# Altium schematic symbol library Regulator_Linear.SchLib: 1452 symbols (part 6 of 10)
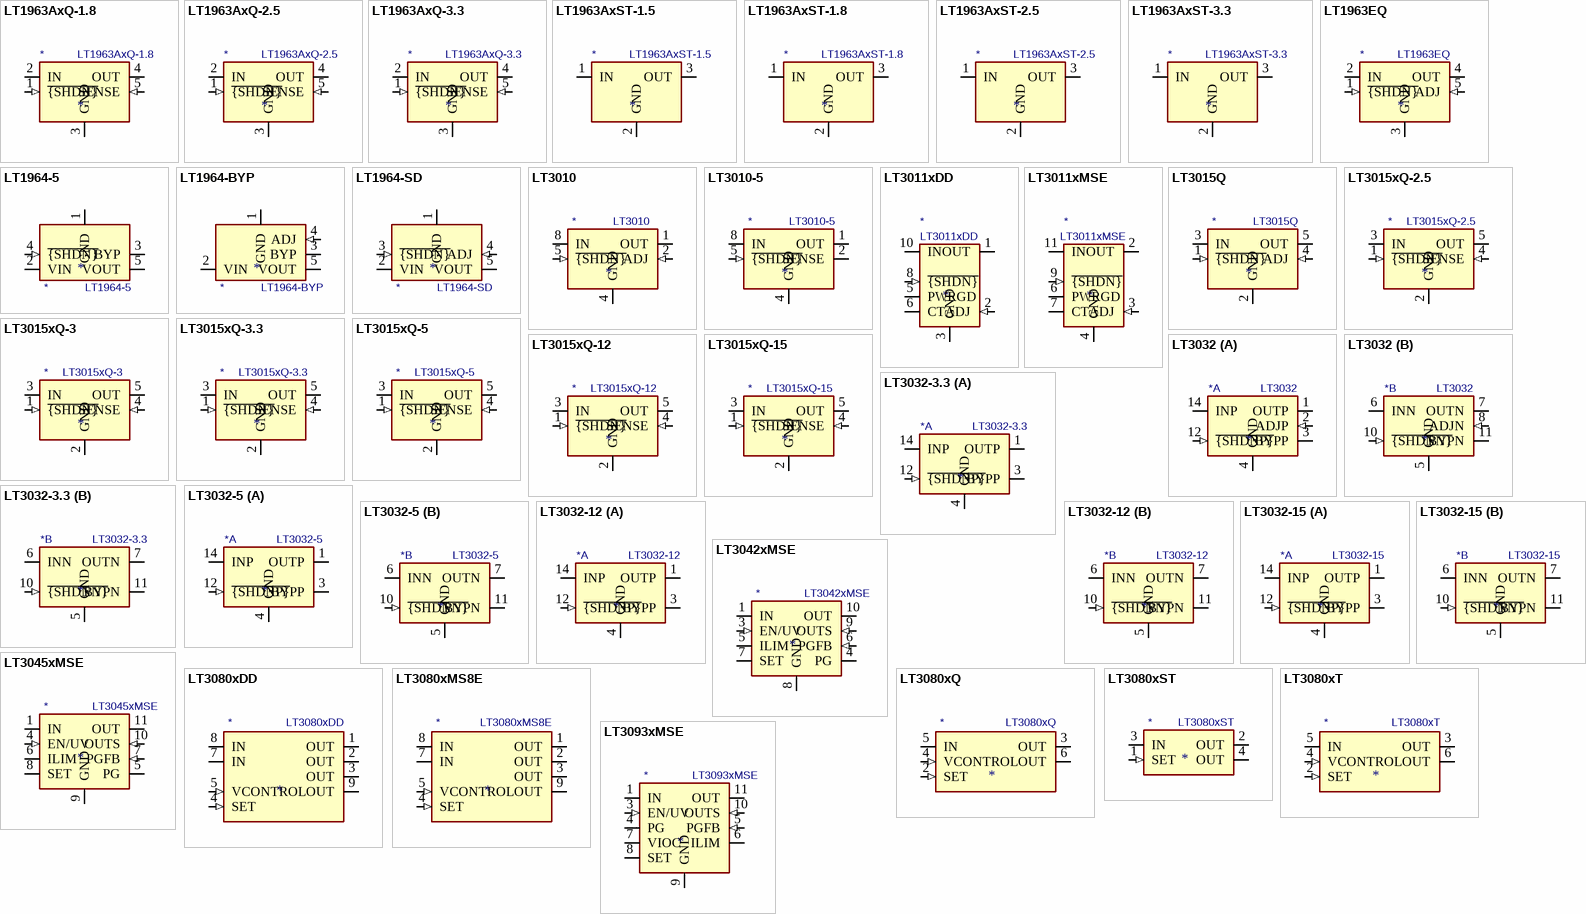
[diagram p41: symbols LT1963AxQ-1.8 to LT3093xMSE]

## LT3032-12
designator *  value LT3032-12
ki_keywords: LDO low noise; ki_description: 150mA, Dual Low Dropout Linear Regulator, Positive/Negative Low Noise, 12V Output, DFN-14; ki_fp_filters: Linear*DE14MA*; Footprint: Package_DFN_QFN:Linear_DE14MA; Supplier: https://www.analog.com/media/en/technical-documentation/data-sheets/3032ff.pdf
footprint Linear_DE14MA
part A pins: 1 OUTP (power), 2 NC (in) hidden, 3 BYPP, 4 GND (power), 12 ~{{SHDNP}} (in), 13 NC (in) hidden, 14 INP (power)
part B pins: 5 GND (power), 6 INN (power), 7 OUTN (power), 8 NC (in) hidden, 9 INN hidden, 10 ~{{SHDNN}} (in), 11 BYPN

## LT3032-15
designator *  value LT3032-15
ki_keywords: LDO low noise; ki_description: 150mA, Dual Low Dropout Linear Regulator, Positive/Negative Low Noise, 15V Output, DFN-14; ki_fp_filters: Linear*DE14MA*; Footprint: Package_DFN_QFN:Linear_DE14MA; Supplier: https://www.analog.com/media/en/technical-documentation/data-sheets/3032ff.pdf
footprint Linear_DE14MA
part A pins: 1 OUTP (power), 2 NC (in) hidden, 3 BYPP, 4 GND (power), 12 ~{{SHDNP}} (in), 13 NC (in) hidden, 14 INP (power)
part B pins: 5 GND (power), 6 INN (power), 7 OUTN (power), 8 NC (in) hidden, 9 INN hidden, 10 ~{{SHDNN}} (in), 11 BYPN

## LT3042xMSE
designator *  value LT3042xMSE
ki_keywords: linear voltage regulator low-noise; ki_description: 200mA, Adjustable, Ultralow Noise, Ultrahigh PSRR RF Linear Regulator, MSOP-10; ki_fp_filters: MSOP*1EP*3x3mm*P0.5mm*; Footprint: Package_SO:MSOP-10-1EP_3x3mm_P0.5mm_EP1.68x1.88mm; Supplier: https://www.analog.com/media/en/technical-documentation/data-sheets/3042fb.pdf
footprint MSOP-10-1EP_3x3mm_P0.5mm_EP1.68x1.88mm
pins: 1 IN (power), 2 IN hidden, 3 EN/UV (in), 4 PG (oc), 5 ILIM, 6 PGFB (in), 7 SET, 8 GND (power), 9 OUTS (in), 10 OUT (power), 11 GND hidden

## LT3045xMSE
designator *  value LT3045xMSE
ki_keywords: linear voltage regulator low-noise; ki_description: 500mA, Adjustable, Ultralow Noise, Ultrahigh PSRR Linear Regulator, MSOP-12; ki_fp_filters: MSOP*1EP*3x4mm*P0.65mm*; Footprint: Package_SO:MSOP-12-1EP_3x4mm_P0.65mm_EP1.65x2.85mm; Supplier: https://www.analog.com/media/en/technical-documentation/data-sheets/3045fa.pdf
footprint MSOP-12-1EP_3x4mm_P0.65mm_EP1.65x2.85mm
pins: 1 IN (power), 2 IN hidden, 3 IN hidden, 4 EN/UV (in), 5 PG (oc), 6 ILIM, 7 PGFB (in), 8 SET, 9 GND (power), 10 OUTS (in), 11 OUT (power), 12 OUT hidden, 13 GND hidden

## LT3080xDD
designator *  value LT3080xDD
ki_keywords: Adjustable 1.1A Low Dropout Regulator; ki_description: Adjustable 1.1A Single Resistor Low Dropout Regulator, DFN-8; ki_fp_filters: DFN*1EP?3x3mm*P0.5mm*; Footprint: Package_DFN_QFN:DFN-8-1EP_3x3mm_P0.5mm_EP1.66x2.38mm; Supplier: https://www.analog.com/media/en/technical-documentation/data-sheets/3080fc.pdf
footprint DFN-8-1EP_3x3mm_P0.5mm_EP1.66x2.38mm
pins: 1 OUT (power), 2 OUT (power), 3 OUT (power), 4 SET (in), 5 VCONTROL (in), 6 NC (in) hidden, 7 IN (power), 8 IN (power), 9 OUT (power)

## LT3080xMS8E
designator *  value LT3080xMS8E
ki_keywords: Adjustable 1.1A Low Dropout Regulator; ki_description: Adjustable 1.1A Single Resistor Low Dropout Regulator, MSOP-8; ki_fp_filters: MSOP*1EP?3x3mm*P0.65mm*; Footprint: Package_SO:MSOP-8-1EP_3x3mm_P0.65mm_EP1.68x1.88mm; Supplier: https://www.analog.com/media/en/technical-documentation/data-sheets/3080fc.pdf
footprint MSOP-8-1EP_3x3mm_P0.65mm_EP1.68x1.88mm
pins: 1 OUT (power), 2 OUT (power), 3 OUT (power), 4 SET (in), 5 VCONTROL (in), 6 NC (in) hidden, 7 IN (power), 8 IN (power), 9 OUT (power)

## LT3080xQ
designator *  value LT3080xQ
ki_keywords: Adjustable 1.1A Low Dropout Regulator; ki_description: Adjustable 1.1A Single Resistor Low Dropout Regulator, TO-220; ki_fp_filters: TO?263*TabPin3*; Footprint: Package_TO_SOT_SMD:TO-263-5_TabPin3; Supplier: https://www.analog.com/media/en/technical-documentation/data-sheets/3080fc.pdf
footprint TO-263-5_TabPin3
pins: 1 NC (in) hidden, 2 SET (in), 3 OUT (power), 4 VCONTROL (in), 5 IN (power), 6 OUT (power)

## LT3080xST
designator *  value LT3080xST
ki_keywords: Adjustable 1.1A Low Dropout Regulator; ki_description: Adjustable 1.1A Single Resistor Low Dropout Regulator, SOT-223; ki_fp_filters: SOT?223*; Footprint: Package_TO_SOT_SMD:SOT-223; Supplier: https://www.analog.com/media/en/technical-documentation/data-sheets/3080fc.pdf
footprint SOT-223
pins: 1 SET (in), 2 OUT (power), 3 IN (power), 4 OUT (power)

## LT3080xT
designator *  value LT3080xT
ki_keywords: Adjustable 1.1A Low Dropout Regulator; ki_description: Adjustable 1.1A Single Resistor Low Dropout Regulator, TO-220; ki_fp_filters: TO?220*StaggerOdd*; Footprint: Package_TO_SOT_THT:TO-220-5_P3.4x3.7mm_StaggerOdd_Lead3.8mm_Vertical; Supplier: https://www.analog.com/media/en/technical-documentation/data-sheets/3080fc.pdf
footprint TO-220-5_P3.4x3.7mm_StaggerOdd_Lead3.8mm_Vertical
pins: 1 NC (in) hidden, 2 SET (in), 3 OUT (power), 4 VCONTROL (in), 5 IN (power), 6 OUT (power)

## LT3093xMSE
designator *  value LT3093xMSE
ki_keywords: linear negative voltage regulator low-noise; ki_description: -200mA, Adjustable, Ultralow Noise, Ultrahigh PSRR RF Negative Linear Regulator, MSOP-12; ki_fp_filters: MSOP*1EP*3x4mm*P0.65mm*; Footprint: Package_SO:MSOP-12-1EP_3x4mm_P0.65mm_EP1.65x2.85mm; Supplier: https://www.analog.com/media/en/technical-documentation/data-sheets/lt3093.pdf
footprint MSOP-12-1EP_3x4mm_P0.65mm_EP1.65x2.85mm
pins: 1 IN (power), 2 IN hidden, 3 EN/UV (in), 4 PG (oc), 5 PGFB (in), 6 ILIM, 7 VIOC, 8 SET, 9 GND (power), 10 OUTS (in), 11 OUT (power), 12 OUT hidden, 13 IN hidden

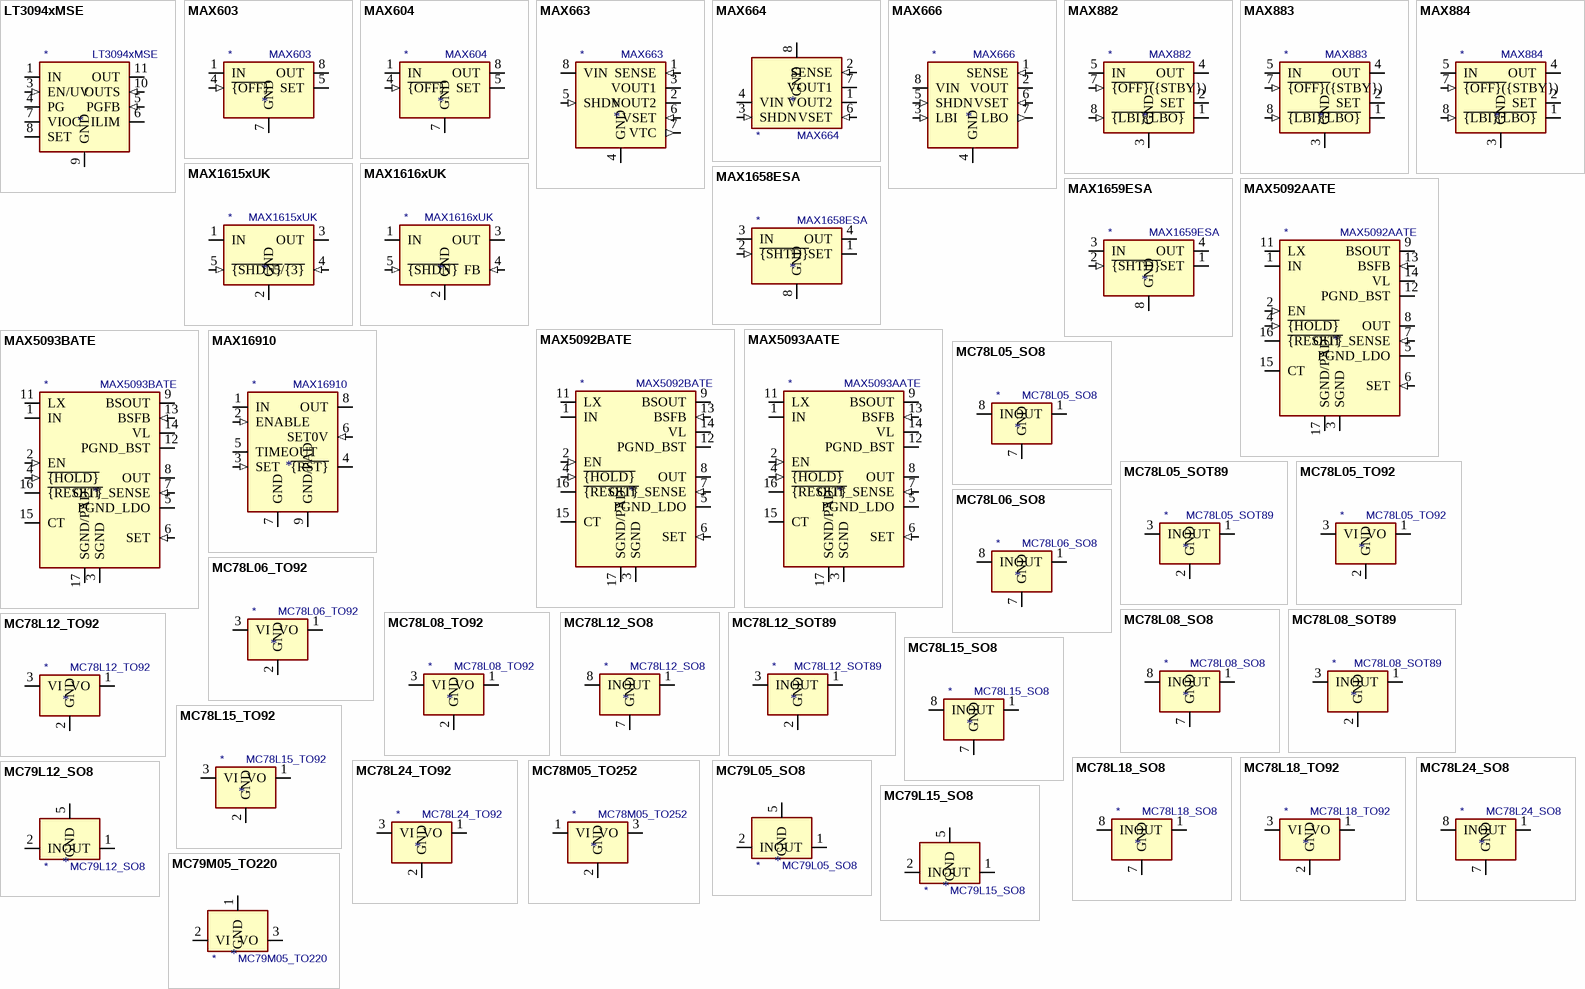
[diagram p20: symbols LT3094xMSE to MC79M05_TO220]

## LT3094xMSE
designator *  value LT3094xMSE
ki_keywords: linear negative voltage regulator low-noise; ki_description: -500mA, Adjustable, Ultralow Noise, Ultrahigh PSRR RF Negative Linear Regulator, MSOP-12; ki_fp_filters: MSOP*1EP*3x4mm*P0.65mm*; Footprint: Package_SO:MSOP-12-1EP_3x4mm_P0.65mm_EP1.65x2.85mm; Supplier: https://www.analog.com/media/en/technical-documentation/data-sheets/LT3094.pdf
footprint MSOP-12-1EP_3x4mm_P0.65mm_EP1.65x2.85mm
pins: 1 IN (power), 2 IN hidden, 3 EN/UV (in), 4 PG (oc), 5 PGFB (in), 6 ILIM, 7 VIOC, 8 SET, 9 GND (power), 10 OUTS (in), 11 OUT (power), 12 OUT hidden, 13 IN hidden

## MAX603
designator *  value MAX603
ki_keywords: Linear LDO Regulator 500mA 5V fixed; ki_description: 500mA Linear LDO Regulator, Fixed Output 5V, DIP-8/SO-8; ki_fp_filters: DIP*W7.62mm* SOIC*3.9x4.9mm*P1.27mm*; Supplier: http://datasheets.maximintegrated.com/en/ds/MAX603-MAX604.pdf
pins: 1 IN (power), 2 GND hidden, 3 GND hidden, 4 ~{{OFF}} (in), 5 SET, 6 GND hidden, 7 GND (power), 8 OUT (power)

## MAX604
designator *  value MAX604
ki_keywords: Linear LDO Regulator 500mA 3.3V fixed; ki_description: 500mA Linear LDO Regulator, Fixed Output 3.3V, DIP-8/SO-8; ki_fp_filters: DIP*W7.62mm* SOIC*3.9x4.9mm*P1.27mm*; Supplier: http://datasheets.maximintegrated.com/en/ds/MAX603-MAX604.pdf
pins: 1 IN (power), 2 GND hidden, 3 GND hidden, 4 ~{{OFF}} (in), 5 SET, 6 GND hidden, 7 GND (power), 8 OUT (power)

## MAX663
designator *  value MAX663
ki_keywords: Linear LDO Regulator 50mA 5V fixed; ki_description: 50mA Dual Mode 5V/Programmable Micropower Voltage Regulator, DIP-8/SO-8; ki_fp_filters: DIP*W7.62mm* SOIC*3.9x4.9mm*P1.27mm*; Supplier: http://pdfserv.maximintegrated.com/en/ds/MAX663-MAX666.pdf
pins: 1 SENSE (in), 2 VOUT2 (power), 3 VOUT1 (power), 4 GND (power), 5 SHDN (in), 6 VSET (in), 7 VTC (out), 8 VIN (power)

## MAX664
designator *  value MAX664
ki_keywords: Linear LDO Regulator 50mA -5V fixed negative; ki_description: 50mA Dual Mode -5V/Programmable Micropower Negative Voltage Regulator, DIP-8/SO-8; ki_fp_filters: DIP*W7.62mm* SOIC*3.9x4.9mm*P1.27mm*; Supplier: http://pdfserv.maximintegrated.com/en/ds/MAX663-MAX666.pdf
pins: 1 VOUT2 (power), 2 SENSE (in), 3 SHDN (in), 4 VIN (power), 5 SHDN (in) hidden, 6 VSET (in), 7 VOUT1 (power), 8 GND (power)

## MAX666
designator *  value MAX666
ki_keywords: Linear LDO Regulator 50mA 5V fixed; ki_description: 50mA Dual Mode 5V/Programmable Micropower Voltage Regulator, DIP-8/SO-8; ki_fp_filters: DIP*W7.62mm* SOIC*3.9x4.9mm*P1.27mm*; Supplier: http://pdfserv.maximintegrated.com/en/ds/MAX663-MAX666.pdf
pins: 1 SENSE (in), 2 VOUT (power), 3 LBI (in), 4 GND (power), 5 SHDN (in), 6 VSET (in), 7 LBO (out), 8 VIN (power)

## MAX882
designator *  value MAX882
ki_keywords: Linear LDO Regulator; ki_description: 200mA Linear LDO Regulator, Fixed Output 3.3V or Adjustable with Standby Mode, 0C to +70C, DIP-8/SO-8; ki_fp_filters: DIP*W7.62mm* SOIC*3.9x4.9mm*P1.27mm*; Supplier: https://datasheets.maximintegrated.com/en/ds/MAX882-MAX884.pdf
pins: 1 ~{{LBO}} (oc), 2 SET, 3 GND (power), 4 OUT (power), 5 IN (power), 6 GND hidden, 7 ~{{OFF}(}{STBY}) (in), 8 ~{{LBI}} (in)

## MAX883
designator *  value MAX883
ki_keywords: Linear LDO Regulator; ki_description: 200mA Linear LDO Regulator, Fixed Output 5V or Adjustable with Shutdown Mode, 0C to +70C, DIP-8/SO-8; ki_fp_filters: DIP*W7.62mm* SOIC*3.9x4.9mm*P1.27mm*; Supplier: https://datasheets.maximintegrated.com/en/ds/MAX882-MAX884.pdf
pins: 1 ~{{LBO}} (oc), 2 SET, 3 GND (power), 4 OUT (power), 5 IN (power), 6 GND hidden, 7 ~{{OFF}(}{STBY}) (in), 8 ~{{LBI}} (in)

## MAX884
designator *  value MAX884
ki_keywords: Linear LDO Regulator; ki_description: 200mA Linear LDO Regulator, Fixed Output 3.3V or Adjustable with Shutdown Mode, 0C to +70C, DIP-8/SO-8; ki_fp_filters: DIP*W7.62mm* SOIC*3.9x4.9mm*P1.27mm*; Supplier: https://datasheets.maximintegrated.com/en/ds/MAX882-MAX884.pdf
pins: 1 ~{{LBO}} (oc), 2 SET, 3 GND (power), 4 OUT (power), 5 IN (power), 6 GND hidden, 7 ~{{OFF}(}{STBY}) (in), 8 ~{{LBI}} (in)

## MAX1615xUK
designator *  value MAX1615xUK
ki_keywords: Linear Voltage Regulator; ki_description: High Voltage, Low Power Linear Regulator for Notebook PCs - 3.3V or 5V Fixed; ki_fp_filters: SOT?23?5*; Footprint: Package_TO_SOT_SMD:SOT-23-5; Supplier: https://datasheets.maximintegrated.com/en/ds/MAX1615-MAX1616.pdf
footprint SOT-23-5
pins: 1 IN (power), 2 GND (power), 3 OUT (power), 4 5/~{{3}} (in), 5 ~{{SHDN}} (in)

## MAX1616xUK
designator *  value MAX1616xUK
ki_keywords: Linear Voltage Regulator; ki_description: High Voltage, Low Power Linear Regulator for Notebook PCs - Adjustable; ki_fp_filters: SOT?23?5*; Footprint: Package_TO_SOT_SMD:SOT-23-5; Supplier: https://datasheets.maximintegrated.com/en/ds/MAX1615-MAX1616.pdf
footprint SOT-23-5
pins: 1 IN (power), 2 GND (power), 3 OUT (power), 4 FB (in), 5 ~{{SHDN}} (in)

## MAX1658ESA
designator *  value MAX1658ESA
ki_keywords: Linear LDO Regulator 350mA 3.3V; ki_description: 350mA Linear LDO Regulator, Fixed Output 3.3V, SO-8; ki_fp_filters: SOIC*3.9x4.9mm*P1.27mm*; Footprint: Package_SO:SOIC-8_3.9x4.9mm_P1.27mm; Supplier: http://datasheets.maximintegrated.com/en/ds/MAX1658-MAX1659.pdf
footprint SOIC-8_3.9x4.9mm_P1.27mm
pins: 1 SET, 2 ~{{SHTD}} (in), 3 IN (power), 4 OUT (power), 5 OUT hidden, 6 IN hidden, 7 IN hidden, 8 GND (power)

## MAX1659ESA
designator *  value MAX1659ESA
ki_keywords: Linear LDO Regulator 350mA 5V; ki_description: 350mA Linear LDO Regulator, Fixed Output 5V, SO-8; ki_fp_filters: SOIC*3.9x4.9mm*P1.27mm*; Footprint: Package_SO:SOIC-8_3.9x4.9mm_P1.27mm; Supplier: http://datasheets.maximintegrated.com/en/ds/MAX1658-MAX1659.pdf
footprint SOIC-8_3.9x4.9mm_P1.27mm
pins: 1 SET, 2 ~{{SHTD}} (in), 3 IN (power), 4 OUT (power), 5 OUT hidden, 6 IN hidden, 7 IN hidden, 8 GND (power)

## MAX5092AATE
designator *  value MAX5092AATE
ki_keywords: High Voltage 72V Input LDO Boost Preregulator 250mA 3.3V; ki_description: 4V to 72V Input LDOs with Boost Preregulator, 250mA Output, 3.3V Preset Vout, TQFN-16; ki_fp_filters: QFN*5x5mm*P0.8mm*; Footprint: Package_DFN_QFN:QFN-16-1EP_5x5mm_P0.8mm_EP2.7x2.7mm; Supplier: http://datasheets.maximintegrated.com/en/ds/MAX5092-MAX5093.pdf
footprint QFN-16-1EP_5x5mm_P0.8mm_EP2.7x2.7mm
pins: 1 IN (power), 2 EN (in), 3 SGND (power), 4 ~{{HOLD}} (in), 5 PGND_LDO (power), 6 SET (in), 7 OUT_SENSE (in), 8 OUT (power), 9 BSOUT (power), 10 LX hidden, 11 LX, 12 PGND_BST (power), 13 BSFB (in), 14 VL, 15 CT, 16 ~{{RESET}} (oc), 17 SGND/PAD (power)

## MAX5092BATE
designator *  value MAX5092BATE
ki_keywords: High Voltage 72V Input LDO Boost Preregulator 250mA 5V; ki_description: 4V to 72V Input LDOs with Boost Preregulator, 250mA Output, 5V Preset Vout, TQFN-16; ki_fp_filters: QFN*5x5mm*P0.8mm*; Footprint: Package_DFN_QFN:QFN-16-1EP_5x5mm_P0.8mm_EP2.7x2.7mm; Supplier: http://datasheets.maximintegrated.com/en/ds/MAX5092-MAX5093.pdf
footprint QFN-16-1EP_5x5mm_P0.8mm_EP2.7x2.7mm
pins: 1 IN (power), 2 EN (in), 3 SGND (power), 4 ~{{HOLD}} (in), 5 PGND_LDO (power), 6 SET (in), 7 OUT_SENSE (in), 8 OUT (power), 9 BSOUT (power), 10 LX hidden, 11 LX, 12 PGND_BST (power), 13 BSFB (in), 14 VL, 15 CT, 16 ~{{RESET}} (oc), 17 SGND/PAD (power)

## MAX5093AATE
designator *  value MAX5093AATE
ki_keywords: High Voltage 72V Input LDO Boost Preregulator 250mA 3.3V; ki_description: 4V to 72V Input LDOs with Boost Preregulator, 250mA Output, 3.3V Preset Vout, TQFN-16; ki_fp_filters: QFN*5x5mm*P0.8mm*; Footprint: Package_DFN_QFN:QFN-16-1EP_5x5mm_P0.8mm_EP2.7x2.7mm; Supplier: http://datasheets.maximintegrated.com/en/ds/MAX5092-MAX5093.pdf
footprint QFN-16-1EP_5x5mm_P0.8mm_EP2.7x2.7mm
pins: 1 IN (power), 2 EN (in), 3 SGND (power), 4 ~{{HOLD}} (in), 5 PGND_LDO (power), 6 SET (in), 7 OUT_SENSE (in), 8 OUT (power), 9 BSOUT (power), 10 LX hidden, 11 LX, 12 PGND_BST (power), 13 BSFB (in), 14 VL, 15 CT, 16 ~{{RESET}} (oc), 17 SGND/PAD (power)

## MAX5093BATE
designator *  value MAX5093BATE
ki_keywords: High Voltage 72V Input LDO Boost Preregulator 250mA 5V; ki_description: 4V to 72V Input LDOs with Boost Preregulator, 250mA Output, 5V Preset Vout, TQFN-16; ki_fp_filters: QFN*5x5mm*P0.8mm*; Footprint: Package_DFN_QFN:QFN-16-1EP_5x5mm_P0.8mm_EP2.7x2.7mm; Supplier: http://datasheets.maximintegrated.com/en/ds/MAX5092-MAX5093.pdf
footprint QFN-16-1EP_5x5mm_P0.8mm_EP2.7x2.7mm
pins: 1 IN (power), 2 EN (in), 3 SGND (power), 4 ~{{HOLD}} (in), 5 PGND_LDO (power), 6 SET (in), 7 OUT_SENSE (in), 8 OUT (power), 9 BSOUT (power), 10 LX hidden, 11 LX, 12 PGND_BST (power), 13 BSFB (in), 14 VL, 15 CT, 16 ~{{RESET}} (oc), 17 SGND/PAD (power)

## MAX16910
designator *  value MAX16910
ki_keywords: Linear LDO Regulator; ki_description: 200mA Automotive Linear LDO Regulator, Fixed Output 5V/3.3V or Adjustable, SO-8/DFN-8; ki_fp_filters: SOIC*3.9x4.9mm*P1.27mm* DFN*3x3mm*P0.65mm*; Supplier: https://datasheets.maximintegrated.com/en/ds/MAX16910.pdf
pins: 1 IN (power), 2 ENABLE (in), 3 SET (in), 4 ~{{RST}} (oc), 5 TIMEOUT, 6 SET0V (in), 7 GND (power), 8 OUT (power), 9 GND/PAD (power)

## MC78L05_SO8
designator *  value MC78L05_SO8
ki_keywords: Voltage Regulator 100mA Positive; ki_description: Positive 100mA 30V Linear Regulator, Fixed Output 5V, SO-8; ki_fp_filters: SOIC*3.9x4.9mm*P1.27mm*; Footprint: Package_SO:SOIC-8_3.9x4.9mm_P1.27mm; Supplier: https://www.onsemi.com/pub/Collateral/MC78L00A-D.PDF
footprint SOIC-8_3.9x4.9mm_P1.27mm
pins: 1 OUT (power), 2 GND hidden, 3 GND hidden, 4 NC (in) hidden, 5 NC (in) hidden, 6 GND hidden, 7 GND (power), 8 IN (power)

## MC78L05_SOT89
designator *  value MC78L05_SOT89
ki_keywords: Voltage Regulator 100mA Positive; ki_description: Positive 100mA 30V Linear Regulator, Fixed Output 5V, SOT-89; ki_fp_filters: SOT?89*; Footprint: Package_TO_SOT_SMD:SOT-89-3; Supplier: https://www.onsemi.com/pub/Collateral/MC78L00A-D.PDF
footprint SOT-89-3
pins: 1 OUT (power), 2 GND (power), 3 IN (power)

## MC78L05_TO92
designator *  value MC78L05_TO92
ki_keywords: Voltage Regulator 100mA Positive; ki_description: Positive 100mA 30V Linear Regulator, Fixed Output 5V, TO-92; ki_fp_filters: TO?92*; Footprint: Package_TO_SOT_THT:TO-92_Inline; Supplier: https://www.onsemi.com/pub/Collateral/MC78L00A-D.PDF
footprint TO-92_Inline
pins: 1 VO (power), 2 GND (power), 3 VI (power)

## MC78L06_SO8
designator *  value MC78L06_SO8
ki_keywords: Voltage Regulator 100mA Positive; ki_description: Positive 100mA 30V Linear Regulator, Fixed Output 6V, SO-8; ki_fp_filters: SOIC*3.9x4.9mm*P1.27mm*; Footprint: Package_SO:SOIC-8_3.9x4.9mm_P1.27mm; Supplier: https://www.onsemi.com/pub/Collateral/MC78L00A-D.PDF
footprint SOIC-8_3.9x4.9mm_P1.27mm
pins: 1 OUT (power), 2 GND hidden, 3 GND hidden, 4 NC (in) hidden, 5 NC (in) hidden, 6 GND hidden, 7 GND (power), 8 IN (power)

## MC78L06_TO92
designator *  value MC78L06_TO92
ki_keywords: Voltage Regulator 100mA Positive; ki_description: Positive 100mA 30V Linear Regulator, Fixed Output 6V, TO-92; ki_fp_filters: TO?92*; Footprint: Package_TO_SOT_THT:TO-92_Inline; Supplier: https://www.onsemi.com/pub/Collateral/MC78L00A-D.PDF
footprint TO-92_Inline
pins: 1 VO (power), 2 GND (power), 3 VI (power)

## MC78L08_SO8
designator *  value MC78L08_SO8
ki_keywords: Voltage Regulator 100mA Positive; ki_description: Positive 100mA 30V Linear Regulator, Fixed Output 8V, SO-8; ki_fp_filters: SOIC*3.9x4.9mm*P1.27mm*; Footprint: Package_SO:SOIC-8_3.9x4.9mm_P1.27mm; Supplier: https://www.onsemi.com/pub/Collateral/MC78L00A-D.PDF
footprint SOIC-8_3.9x4.9mm_P1.27mm
pins: 1 OUT (power), 2 GND hidden, 3 GND hidden, 4 NC (in) hidden, 5 NC (in) hidden, 6 GND hidden, 7 GND (power), 8 IN (power)

## MC78L08_SOT89
designator *  value MC78L08_SOT89
ki_keywords: Voltage Regulator 100mA Positive; ki_description: Positive 100mA 30V Linear Regulator, Fixed Output 8V, SOT-89; ki_fp_filters: SOT?89*; Footprint: Package_TO_SOT_SMD:SOT-89-3; Supplier: https://www.onsemi.com/pub/Collateral/MC78L00A-D.PDF
footprint SOT-89-3
pins: 1 OUT (power), 2 GND (power), 3 IN (power)

## MC78L08_TO92
designator *  value MC78L08_TO92
ki_keywords: Voltage Regulator 100mA Positive; ki_description: Positive 100mA 30V Linear Regulator, Fixed Output 8V, TO-92; ki_fp_filters: TO?92*; Footprint: Package_TO_SOT_THT:TO-92_Inline; Supplier: https://www.onsemi.com/pub/Collateral/MC78L00A-D.PDF
footprint TO-92_Inline
pins: 1 VO (power), 2 GND (power), 3 VI (power)

## MC78L12_SO8
designator *  value MC78L12_SO8
ki_keywords: Voltage Regulator 100mA Positive; ki_description: Positive 100mA 30V Linear Regulator, Fixed Output 12V, SO-8; ki_fp_filters: SOIC*3.9x4.9mm*P1.27mm*; Footprint: Package_SO:SOIC-8_3.9x4.9mm_P1.27mm; Supplier: https://www.onsemi.com/pub/Collateral/MC78L00A-D.PDF
footprint SOIC-8_3.9x4.9mm_P1.27mm
pins: 1 OUT (power), 2 GND hidden, 3 GND hidden, 4 NC (in) hidden, 5 NC (in) hidden, 6 GND hidden, 7 GND (power), 8 IN (power)

## MC78L12_SOT89
designator *  value MC78L12_SOT89
ki_keywords: Voltage Regulator 100mA Positive; ki_description: Positive 100mA 30V Linear Regulator, Fixed Output 12V, SOT-89; ki_fp_filters: SOT?89*; Footprint: Package_TO_SOT_SMD:SOT-89-3; Supplier: https://www.onsemi.com/pub/Collateral/MC78L00A-D.PDF
footprint SOT-89-3
pins: 1 OUT (power), 2 GND (power), 3 IN (power)

## MC78L12_TO92
designator *  value MC78L12_TO92
ki_keywords: Voltage Regulator 100mA Positive; ki_description: Positive 100mA 30V Linear Regulator, Fixed Output 12V, TO-92; ki_fp_filters: TO?92*; Footprint: Package_TO_SOT_THT:TO-92_Inline; Supplier: https://www.onsemi.com/pub/Collateral/MC78L00A-D.PDF
footprint TO-92_Inline
pins: 1 VO (power), 2 GND (power), 3 VI (power)

## MC78L15_SO8
designator *  value MC78L15_SO8
ki_keywords: Voltage Regulator 100mA Positive; ki_description: Positive 100mA 30V Linear Regulator, Fixed Output 15V, SO-8; ki_fp_filters: SOIC*3.9x4.9mm*P1.27mm*; Footprint: Package_SO:SOIC-8_3.9x4.9mm_P1.27mm; Supplier: https://www.onsemi.com/pub/Collateral/MC78L00A-D.PDF
footprint SOIC-8_3.9x4.9mm_P1.27mm
pins: 1 OUT (power), 2 GND hidden, 3 GND hidden, 4 NC (in) hidden, 5 NC (in) hidden, 6 GND hidden, 7 GND (power), 8 IN (power)

## MC78L15_TO92
designator *  value MC78L15_TO92
ki_keywords: Voltage Regulator 100mA Positive; ki_description: Positive 100mA 30V Linear Regulator, Fixed Output 15V, TO-92; ki_fp_filters: TO?92*; Footprint: Package_TO_SOT_THT:TO-92_Inline; Supplier: https://www.onsemi.com/pub/Collateral/MC78L00A-D.PDF
footprint TO-92_Inline
pins: 1 VO (power), 2 GND (power), 3 VI (power)

## MC78L18_SO8
designator *  value MC78L18_SO8
ki_keywords: Voltage Regulator 100mA Positive; ki_description: Positive 100mA 30V Linear Regulator, Fixed Output 18V, SO-8; ki_fp_filters: SOIC*3.9x4.9mm*P1.27mm*; Footprint: Package_SO:SOIC-8_3.9x4.9mm_P1.27mm; Supplier: http://pdf.datasheetcatalog.com/datasheet/vishay/mc78l00.pdf
footprint SOIC-8_3.9x4.9mm_P1.27mm
pins: 1 OUT (power), 2 GND hidden, 3 GND hidden, 4 NC (in) hidden, 5 NC (in) hidden, 6 GND hidden, 7 GND (power), 8 IN (power)

## MC78L18_TO92
designator *  value MC78L18_TO92
ki_keywords: Voltage Regulator 100mA Positive; ki_description: Positive 100mA 30V Linear Regulator, Fixed Output 18V, TO-92; ki_fp_filters: TO?92*; Footprint: Package_TO_SOT_THT:TO-92_Inline; Supplier: http://pdf.datasheetcatalog.com/datasheet/vishay/mc78l00.pdf
footprint TO-92_Inline
pins: 1 VO (power), 2 GND (power), 3 VI (power)

## MC78L24_SO8
designator *  value MC78L24_SO8
ki_keywords: Voltage Regulator 100mA Positive; ki_description: Positive 100mA 30V Linear Regulator, Fixed Output 24V, SO-8; ki_fp_filters: SOIC*3.9x4.9mm*P1.27mm*; Footprint: Package_SO:SOIC-8_3.9x4.9mm_P1.27mm; Supplier: http://pdf.datasheetcatalog.com/datasheet/vishay/mc78l00.pdf
footprint SOIC-8_3.9x4.9mm_P1.27mm
pins: 1 OUT (power), 2 GND hidden, 3 GND hidden, 4 NC (in) hidden, 5 NC (in) hidden, 6 GND hidden, 7 GND (power), 8 IN (power)

## MC78L24_TO92
designator *  value MC78L24_TO92
ki_keywords: Voltage Regulator 100mA Positive; ki_description: Positive 100mA 30V Linear Regulator, Fixed Output 24V, TO-92; ki_fp_filters: TO?92*; Footprint: Package_TO_SOT_THT:TO-92_Inline; Supplier: http://pdf.datasheetcatalog.com/datasheet/vishay/mc78l00.pdf
footprint TO-92_Inline
pins: 1 VO (power), 2 GND (power), 3 VI (power)

## MC78M05_TO252
designator *  value MC78M05_TO252
ki_keywords: Voltage Regulator 500mA Positive; ki_description: Positive 500mA 35V Linear Regulator, Fixed Output 5V, TO-252 (D-PAK); ki_fp_filters: TO?252*; Footprint: Package_TO_SOT_SMD:TO-252-2; Supplier: https://www.onsemi.com/pub/Collateral/MC78M00-D.PDF
footprint TO-252-2
pins: 1 VI (power), 2 GND (power), 3 VO (power)

## MC79L05_SO8
designator *  value MC79L05_SO8
ki_keywords: Voltage Regulator 100mA Negative; ki_description: Negative 100mA -30V Linear Regulator, Fixed Output -5V, SO-8; ki_fp_filters: SOIC?8*3.9x4.9mm*P1.27mm*; Footprint: Package_SO:SOIC-8_3.9x4.9mm_P1.27mm; Supplier: http://www.ti.com/lit/ds/symlink/lm79l.pdf
footprint SOIC-8_3.9x4.9mm_P1.27mm
pins: 1 OUT (power), 2 IN (power), 3 IN hidden, 4 NC (in) hidden, 5 GND (power), 6 IN hidden, 7 IN hidden, 8 NC (in) hidden

## MC79L12_SO8
designator *  value MC79L12_SO8
ki_keywords: Voltage Regulator 100mA Negative; ki_description: Negative 100mA -35V Linear Regulator, Fixed Output -12V, SO-8; ki_fp_filters: SOIC?8*3.9x4.9mm*P1.27mm*; Footprint: Package_SO:SOIC-8_3.9x4.9mm_P1.27mm; Supplier: http://www.ti.com/lit/ds/symlink/lm79l.pdf
footprint SOIC-8_3.9x4.9mm_P1.27mm
pins: 1 OUT (power), 2 IN (power), 3 IN hidden, 4 NC (in) hidden, 5 GND (power), 6 IN hidden, 7 IN hidden, 8 NC (in) hidden

## MC79L15_SO8
designator *  value MC79L15_SO8
ki_keywords: Voltage Regulator 100mA Negative; ki_description: Negative 100mA -35V Linear Regulator, Fixed Output -15V, SO-8; ki_fp_filters: SOIC?8*3.9x4.9mm*P1.27mm*; Footprint: Package_SO:SOIC-8_3.9x4.9mm_P1.27mm; Supplier: http://www.ti.com/lit/ds/symlink/lm79l.pdf
footprint SOIC-8_3.9x4.9mm_P1.27mm
pins: 1 OUT (power), 2 IN (power), 3 IN hidden, 4 NC (in) hidden, 5 GND (power), 6 IN hidden, 7 IN hidden, 8 NC (in) hidden

## MC79M05_TO220
designator *  value MC79M05_TO220
ki_keywords: Voltage Regulator 500mA Negative; ki_description: Negative 500mA 35V Linear Regulator, Fixed Output -5V, TO-220; ki_fp_filters: TO?220*; Footprint: Package_TO_SOT_THT:TO-220-3_Vertical; Supplier: http://www.onsemi.com/pub/Collateral/MC79M00-D.PDF
footprint TO-220-3_Vertical
pins: 1 GND (power), 2 VI (power), 3 VO (power)

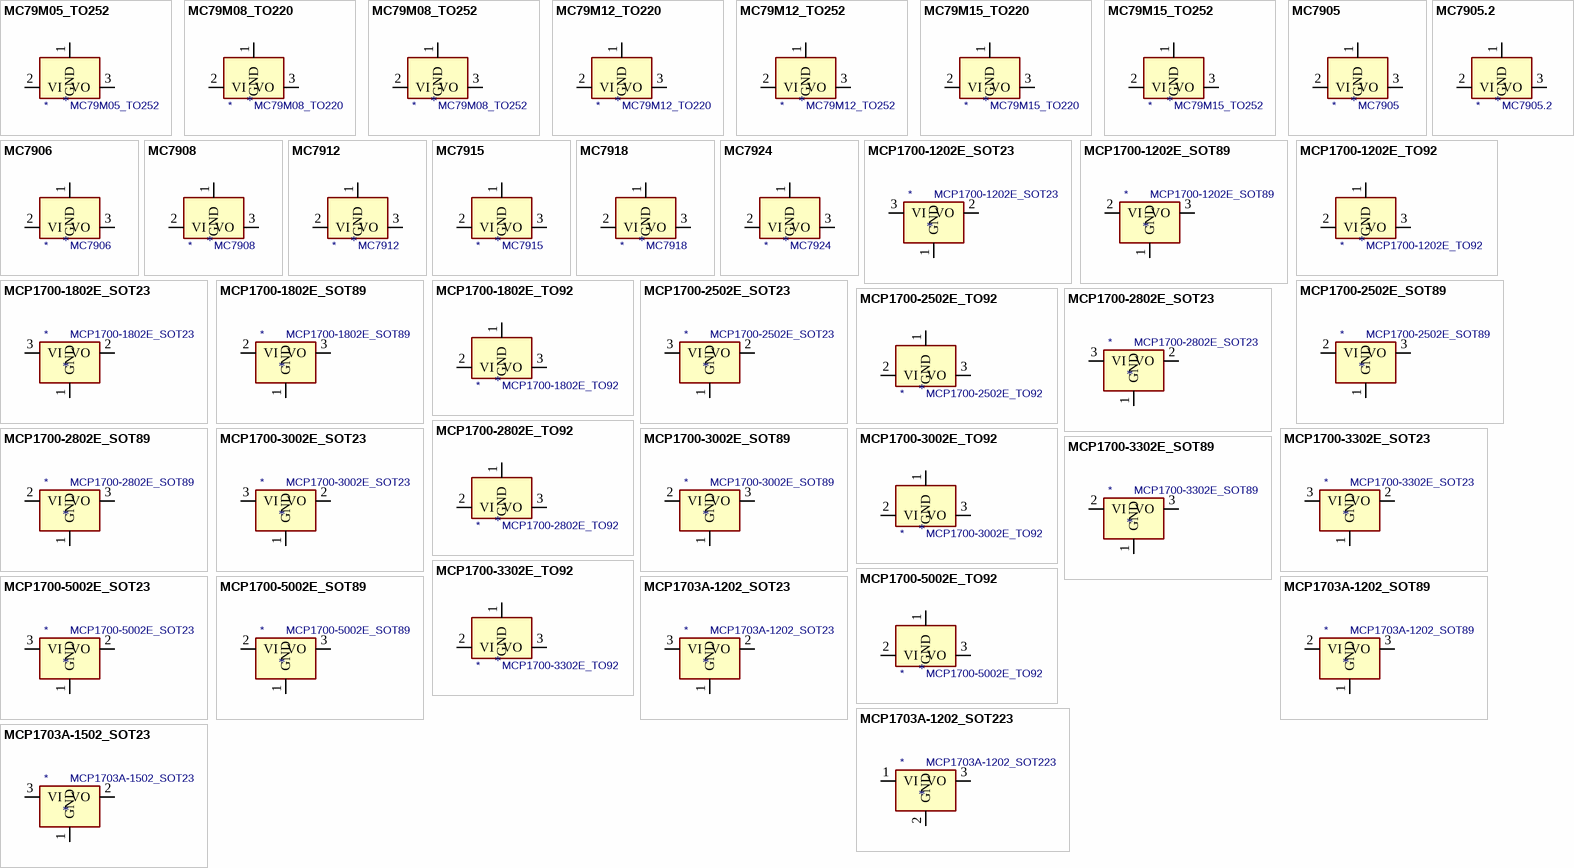
[diagram p21: symbols MC79M05_TO252 to MCP1703A-1502_SOT23]

## MC79M05_TO252
designator *  value MC79M05_TO252
ki_keywords: Voltage Regulator 500mA Negative; ki_description: Negative 500mA 35V Linear Regulator, Fixed Output -5V, TO-252; ki_fp_filters: TO?252*; Footprint: Package_TO_SOT_SMD:TO-252-2; Supplier: http://www.onsemi.com/pub/Collateral/MC79M00-D.PDF
footprint TO-252-2
pins: 1 GND (power), 2 VI (power), 3 VO (power)

## MC79M08_TO220
designator *  value MC79M08_TO220
ki_keywords: Voltage Regulator 500mA Negative; ki_description: Negative 500mA 35V Linear Regulator, Fixed Output -8V, TO-220; ki_fp_filters: TO?220*; Footprint: Package_TO_SOT_THT:TO-220-3_Vertical; Supplier: http://www.onsemi.com/pub/Collateral/MC79M00-D.PDF
footprint TO-220-3_Vertical
pins: 1 GND (power), 2 VI (power), 3 VO (power)

## MC79M08_TO252
designator *  value MC79M08_TO252
ki_keywords: Voltage Regulator 500mA Negative; ki_description: Negative 500mA 35V Linear Regulator, Fixed Output -8V, TO-252; ki_fp_filters: TO?252*; Footprint: Package_TO_SOT_SMD:TO-252-2; Supplier: http://www.onsemi.com/pub/Collateral/MC79M00-D.PDF
footprint TO-252-2
pins: 1 GND (power), 2 VI (power), 3 VO (power)

## MC79M12_TO220
designator *  value MC79M12_TO220
ki_keywords: Voltage Regulator 500mA Negative; ki_description: Negative 500mA 35V Linear Regulator, Fixed Output -12V, TO-220; ki_fp_filters: TO?220*; Footprint: Package_TO_SOT_THT:TO-220-3_Vertical; Supplier: http://www.onsemi.com/pub/Collateral/MC79M00-D.PDF
footprint TO-220-3_Vertical
pins: 1 GND (power), 2 VI (power), 3 VO (power)

## MC79M12_TO252
designator *  value MC79M12_TO252
ki_keywords: Voltage Regulator 500mA Negative; ki_description: Negative 500mA 35V Linear Regulator, Fixed Output -12V, TO-252; ki_fp_filters: TO?252*; Footprint: Package_TO_SOT_SMD:TO-252-2; Supplier: http://www.onsemi.com/pub/Collateral/MC79M00-D.PDF
footprint TO-252-2
pins: 1 GND (power), 2 VI (power), 3 VO (power)

## MC79M15_TO220
designator *  value MC79M15_TO220
ki_keywords: Voltage Regulator 500mA Negative; ki_description: Negative 500mA 35V Linear Regulator, Fixed Output -15V, TO-220; ki_fp_filters: TO?220*; Footprint: Package_TO_SOT_THT:TO-220-3_Vertical; Supplier: http://www.onsemi.com/pub/Collateral/MC79M00-D.PDF
footprint TO-220-3_Vertical
pins: 1 GND (power), 2 VI (power), 3 VO (power)

## MC79M15_TO252
designator *  value MC79M15_TO252
ki_keywords: Voltage Regulator 500mA Negative; ki_description: Negative 500mA 35V Linear Regulator, Fixed Output -15V, TO-252; ki_fp_filters: TO?252*; Footprint: Package_TO_SOT_SMD:TO-252-2; Supplier: http://www.onsemi.com/pub/Collateral/MC79M00-D.PDF
footprint TO-252-2
pins: 1 GND (power), 2 VI (power), 3 VO (power)

## MC7905
designator *  value MC7905
ki_keywords: Voltage Regulator 1.5A Negative; ki_description: Negative 1A 35V Linear Regulator, Fixed Output -5V, TO-220/TO-263; ki_fp_filters: TO?220* TO?263*; Supplier: http://www.onsemi.com/pub/Collateral/MC7900-D.PDF
pins: 1 GND (power), 2 VI (power), 3 VO (power)

## MC7905.2
designator *  value MC7905.2
ki_keywords: Voltage Regulator 1.5A Negative; ki_description: Negative 1A 35V Linear Regulator, Fixed Output -5.2V, TO-220/TO-263; ki_fp_filters: TO?220* TO?263*; Supplier: http://www.onsemi.com/pub/Collateral/MC7900-D.PDF
pins: 1 GND (power), 2 VI (power), 3 VO (power)

## MC7906
designator *  value MC7906
ki_keywords: Voltage Regulator 1.5A Negative; ki_description: Negative 1A 35V Linear Regulator, Fixed Output -6V, TO-220/TO-263; ki_fp_filters: TO?220* TO?263*; Supplier: http://www.onsemi.com/pub/Collateral/MC7900-D.PDF
pins: 1 GND (power), 2 VI (power), 3 VO (power)

## MC7908
designator *  value MC7908
ki_keywords: Voltage Regulator 1.5A Negative; ki_description: Negative 1A 35V Linear Regulator, Fixed Output -8V, TO-220/TO-263; ki_fp_filters: TO?220* TO?263*; Supplier: http://www.onsemi.com/pub/Collateral/MC7900-D.PDF
pins: 1 GND (power), 2 VI (power), 3 VO (power)

## MC7912
designator *  value MC7912
ki_keywords: Voltage Regulator 1.5A Negative; ki_description: Negative 1A 35V Linear Regulator, Fixed Output -12V, TO-220/TO-263; ki_fp_filters: TO?220* TO?263*; Supplier: http://www.onsemi.com/pub/Collateral/MC7900-D.PDF
pins: 1 GND (power), 2 VI (power), 3 VO (power)

## MC7915
designator *  value MC7915
ki_keywords: Voltage Regulator 1.5A Negative; ki_description: Negative 1A 35V Linear Regulator, Fixed Output -15V, TO-220/TO-263; ki_fp_filters: TO?220* TO?263*; Supplier: http://www.onsemi.com/pub/Collateral/MC7900-D.PDF
pins: 1 GND (power), 2 VI (power), 3 VO (power)

## MC7918
designator *  value MC7918
ki_keywords: Voltage Regulator 1.5A Negative; ki_description: Negative 1A 35V Linear Regulator, Fixed Output -18V, TO-220/TO-263; ki_fp_filters: TO?220* TO?263*; Supplier: http://www.onsemi.com/pub/Collateral/MC7900-D.PDF
pins: 1 GND (power), 2 VI (power), 3 VO (power)

## MC7924
designator *  value MC7924
ki_keywords: Voltage Regulator 1.5A Negative; ki_description: Negative 1A 40V Linear Regulator, Fixed Output -24V, TO-220/TO-263; ki_fp_filters: TO?220* TO?263*; Supplier: http://www.onsemi.com/pub/Collateral/MC7900-D.PDF
pins: 1 GND (power), 2 VI (power), 3 VO (power)

## MCP1700-1202E_SOT23
designator *  value MCP1700-1202E_SOT23
ki_keywords: regulator linear ldo; ki_description: 250mA Low Quiscent Current LDO, 1.2V output, SOT-23; ki_fp_filters: SOT?23*; Footprint: Package_TO_SOT_SMD:SOT-23; Supplier: http://ww1.microchip.com/downloads/en/DeviceDoc/20001826D.pdf
footprint SOT-23
pins: 1 GND (power), 2 VO (power), 3 VI (power)

## MCP1700-1202E_SOT89
designator *  value MCP1700-1202E_SOT89
ki_keywords: regulator linear ldo; ki_description: 250mA Low Quiscent Current LDO, 1.2V output, SOT-89; ki_fp_filters: SOT?89*; Footprint: Package_TO_SOT_SMD:SOT-89-3; Supplier: http://ww1.microchip.com/downloads/en/DeviceDoc/20001826D.pdf
footprint SOT-89-3
pins: 1 GND (power), 2 VI (power), 3 VO (power)

## MCP1700-1202E_TO92
designator *  value MCP1700-1202E_TO92
ki_keywords: regulator linear ldo; ki_description: 250mA Low Quiscent Current LDO, 1.2V output, TO-92; ki_fp_filters: TO?92*; Footprint: Package_TO_SOT_THT:TO-92_Inline; Supplier: http://ww1.microchip.com/downloads/en/DeviceDoc/20001826D.pdf
footprint TO-92_Inline
pins: 1 GND (power), 2 VI (power), 3 VO (power)

## MCP1700-1802E_SOT23
designator *  value MCP1700-1802E_SOT23
ki_keywords: regulator linear ldo; ki_description: 250mA Low Quiscent Current LDO, 1.8V output, SOT-23; ki_fp_filters: SOT?23*; Footprint: Package_TO_SOT_SMD:SOT-23; Supplier: http://ww1.microchip.com/downloads/en/DeviceDoc/20001826D.pdf
footprint SOT-23
pins: 1 GND (power), 2 VO (power), 3 VI (power)
